# Altium footprint library MOLEX THD.PcbLib: 71 footprints (part 4 of 5) (continued)
## MOLEX_74737-0009 [mm] "SFP+ 1x1 Press Fit Cage"
height 9.7
pads (20):
  round 2 hole 1.05: 1(-30.9,7.125) 2(-20.9,7.125) 3(-10.9,7.125) 4(-10.9,1.445) 5(-30.9,-1.455) 6(-10.9,-3.955) 7(-25.9,-7.125) 8(-15.9,-7.125) 9(-5.9,-7.125) 10(4.1,-7.125)
  round 1.65 hole 0.95: 11(-8.1,7.125) 12(-3.4,7.125) 13(1.6,7.125) 14(6.2,4.8) 15(6.2,0) 16(6.2,-4.8) 17(-8.1,-7.125) 18(-3.4,-7.125) 19(1.6,-7.125)
  round 2 hole 0.85: 20(-0.9,7.125)
Top Overlay:
  drawing of 183 lines, arcs and shapes, not listed
Mechanical 8:
  drawing of 301 lines, arcs and shapes, not listed
Mechanical 14:
  drawing of 208 lines, arcs and shapes, not listed
Drill Drawing:
  lines w0.1: -32.1,-0.2 -11.7,-0.2 -8.1,-3.8 -8.1,-6.125 ; -32.1,2.2 -11.7,2.2 -11.4,1.9 ; -32,4.1 -11.7,4.1 -10.8,5 -3.025,5 -1.9,6.125 ; -32.6,-8.125 -32.6,8.125 6.9,8.125 6.9,-8.125 -32.6,-8.125
  text "PRESS-FIT TECHNOLOGY" at -29.4,-1.8 h1
  text "10x diam. 1.05mm +/-0.05" at -32.2,2.625 h1
  text "9x diam. 0.95mm +/-0.05" at -31.6,0.4 h1
  text "1x diam. 0.85mm +/-0.05" at -31.4,4.5 h1
3D body "MOLEX_74737-0009.stp": height 10.32, standoff -3.02, extent -42.402,-7.84 6.578,7.835

## MOLEX_74737-0111 [mm] "SFP+ 1x1 Cage"
height 9.7
pads (20):
  round 2 hole 1.05: 1(-30.9,7.125) 2(-20.9,7.125) 3(-10.9,7.125) 4(-10.9,1.445) 5(-30.9,-1.455) 6(-10.9,-3.955) 7(-25.9,-7.125) 8(-15.9,-7.125) 9(-5.9,-7.125) 10(4.1,-7.125)
  round 1.65 hole 0.95: 11(-8.1,7.125) 12(-3.4,7.125) 13(1.6,7.125) 14(6.2,4.8) 15(6.2,0) 16(6.2,-4.8) 17(-8.1,-7.125) 18(-3.4,-7.125) 19(1.6,-7.125)
  round 2 hole 0.85: 20(-0.9,7.125)
Top Overlay:
  drawing of 183 lines, arcs and shapes, not listed
Mechanical 8:
  drawing of 301 lines, arcs and shapes, not listed
Mechanical 14:
  drawing of 208 lines, arcs and shapes, not listed
3D body "MOLEX_74737-0111.stp": height 10.6, standoff -3, extent -42.4,-8.149 6.4,8.15

## MOLEX_75640-5001 [mm] "Stacked 2x1 SFP Cage, Medium Height Assembly, Press Fit Tails with 4 Light Pipes"
height 25.8
pads (55):
  round 1.55 hole 1.05: 1(-43.53,7.135) 3(-43.53,-7.115) 4(-35.53,7.135) 5(-35.53,-7.115) 6(-27.53,7.135) 7(-27.53,-7.115) 8(-19.53,7.135) 11(-19.53,-7.115) 12(-11.53,7.135) 13(-11.53,-7.115) 16(8.095,4.01) 17(8.095,0.01) 18(8.095,-3.99)
  round 0.5 hole 1.85 unplated mask+0.675: 14(-1.43,5.51) 15(6.07,-5.49)
  rrect100% 0.95x0.95 hole 0.45: L1(-2.158,-3.395) L2(-0.778,-2.595) L3(-2.158,-1.795) L4(-0.778,-0.995) L5(-2.158,-0.195) L6(-0.778,0.605) L7(-2.158,1.405) L8(-0.778,2.205) L9(-2.158,3.005) L10(-0.778,3.805) L11(-3.708,3.405) L12(-5.098,2.605) L13(-3.708,1.805) L14(-5.098,1.005) L15(-3.708,0.205) L16(-5.098,-0.595) L17(-3.708,-1.395) L18(-5.098,-2.195) L19(-3.708,-2.995) L20(-5.098,-3.795) T1(2.162,3.405) T2(0.772,2.605) T3(2.162,1.805) T4(0.772,1.005) T5(2.162,0.205) T6(0.772,-0.595) T7(2.162,-1.395) T8(0.772,-2.195) T9(2.162,-2.995) T10(0.772,-3.795) T11(3.712,-3.395) T12(5.092,-2.595) T13(3.712,-1.795) T14(5.092,-0.995) T15(3.712,-0.195) T16(5.092,0.605) T17(3.712,1.405) T18(5.092,2.205) T19(3.712,3.005) T20(5.092,3.805)
Top Overlay:
  drawing of 178 lines, arcs and shapes, not listed
  text "LOWER" at -6.197,-2.192 h1
  text "UPPER" at 7.003,-2.095 h1
Mechanical 1:
  circle w0.25: c-2.158,-4.47 r0.125
  circle w0.25: c2.162,4.48 r0.125
  text "UPPER" at 7.003,-2.095 h1
  text "LOWER" at -6.197,-2.192 h1
Mechanical 8:
  drawing of 307 lines, arcs and shapes, not listed
  text "PCB EDGE" at -46.722,-3.417 h1
Mechanical 14:
  drawing of 168 lines, arcs and shapes, not listed
Drill Drawing:
  lines w0.1: -42.122,-3.217 -22.597,-3.217 -19.734,-6.08 ; -42.122,-1.092 -7.822,-1.092 -5.734,-3.18 ; -42.097,0.983 -21.972,0.983 -17.222,5.733 -3.097,5.733 ; -48.028,-7.245 -48.028,7.255 9.272,7.255 9.272,-7.245 -48.028,-7.245
  text "PRESS-FIT TECHNOLOGY" at -41.272,3.308 h1
  text "2x diam. 1.85mm +/-0.05" at -42.197,1.408 h1
  text "PRESS-FIT TECHNOLOGY" at -41.272,3.308 h1
  text "40x diam. 0.45mm +0.06/-0.04" at -42.122,-0.542 h1
  text "13x diam. 1.05mm +/-0.05" at -42.122,-2.617 h1
3D body "MOLEX_75640-5001.stp": height 26.56, standoff -3.26, extent -55.03,-8.981 9.274,8.981

## MOLEX_76001-0010 [mm] "250V 50A Press-Fit Tails (10) Screw Terminal (M3) EXTreme ZPower™ Connector for 3.18mm Thick PC Board"
height 9.8
pads (10):
  round 1.7 hole 1: 1(-6.35,-3.175) 1(-6.35,3.175) 1(-3.175,-3.175) 1(-3.175,3.175) 1(0,-3.175) 1(0,3.175) 1(3.175,-3.175) 1(3.175,3.175) 1(6.35,-3.175) 1(6.35,3.175)
Top Overlay:
  circle w0.2: c0,0 r1.612
  circle w0.2: c0,0 r1.8
  circle w0.2: c4.28,0 r2
  circle w0.2: c-4.28,0 r2
  lines w0.2: -8.145,-4.6 -8.145,4.6 8.145,4.6 8.145,-4.6 -8.145,-4.6
Mechanical 8:
  circle w0.1: c-6.35,3.175 r0.85
  circle w0.1: c-6.35,3.175 r0.5
  lines w0.1: -6.85,-3.175 -6.35,-3.175 ; -6.85,3.175 -6.35,3.175 ; -6.35,-3.675 -6.35,-3.175 ; -6.35,-2.675 -6.35,-3.175 ; -6.35,2.675 -6.35,3.175 ; -6.35,3.675 -6.35,3.175 ; -5.85,-3.175 -6.35,-3.175 ; -5.85,3.175 -6.35,3.175 ; -3.675,-3.175 -3.175,-3.175 ; -3.675,3.175 -3.175,3.175 ; -3.175,-3.675 -3.175,-3.175 ; -3.175,-2.675 -3.175,-3.175 ; -3.175,2.675 -3.175,3.175 ; -3.175,3.675 -3.175,3.175 ; -2.675,-3.175 -3.175,-3.175 ; -2.675,3.175 -3.175,3.175 ; -0.5,-3.175 0,-3.175 ; -0.5,0 0,0 ; -0.5,3.175 0,3.175 ; 0,-3.675 0,-3.175 ; 0,-2.675 0,-3.175 ; 0,-0.5 0,0 ; 0,0.5 0,0 ; 0,2.675 0,3.175 ; 0,3.675 0,3.175 ; 0.5,-3.175 0,-3.175 ; 0.5,0 0,0 ; 0.5,3.175 0,3.175 ; 2.675,-3.175 3.175,-3.175 ; 2.675,3.175 3.175,3.175 ; 3.175,-3.675 3.175,-3.175 ; 3.175,-2.675 3.175,-3.175 ; 3.175,2.675 3.175,3.175 ; 3.175,3.675 3.175,3.175 ; 3.675,-3.175 3.175,-3.175 ; 3.675,3.175 3.175,3.175 ; 5.85,-3.175 6.35,-3.175 ; 5.85,3.175 6.35,3.175 ; 6.35,-3.675 6.35,-3.175 ; 6.35,-2.675 6.35,-3.175 ; 6.35,2.675 6.35,3.175 ; 6.35,3.675 6.35,3.175 ; 6.85,-3.175 6.35,-3.175 ; 6.85,3.175 6.35,3.175
Mechanical 14:
  circle w0.1: c0,0 r1.612
  circle w0.1: c0,0 r1.8
  circle w0.1: c4.28,0 r2
  circle w0.1: c-4.28,0 r2
  lines w0.1: -7.58,-3.8 -7.38,-3.6 ; -7.58,-3.8 -7.58,3.8 ; -7.58,-3.8 7.58,-3.8 ; -7.58,3.8 -7.38,3.6 ; -7.58,3.8 7.58,3.8 ; -7.38,-3.6 -7.38,3.6 ; -7.38,-3.6 7.38,-3.6 ; -7.38,3.6 7.38,3.6 ; 7.38,-3.6 7.58,-3.8 ; 7.38,-3.6 7.38,3.6 ; 7.38,3.6 7.58,3.8 ; 7.58,-3.8 7.58,3.8 ; -8.145,-4.6 -8.145,4.6 8.145,4.6 8.145,-4.6 -8.145,-4.6 ; -7.036,-2.772 7.036,-2.772 7.036,2.772 -7.036,2.772 -7.036,-2.772
Drill Drawing:
  text "+0.07 / -0.03" at -5.2,-1.9 h1
  text "PRESS-FIT TECHNOLOGY" at -8.5,0.9 h1
  text "diam. 1mm" at -4.7,-0.5 h1
3D body "MOLEX_76001-0010.stp": height 9.94, standoff -3.9, extent -8.145,-4.6 8.145,4.6

## MOLEX_79107-7006 [mm] "2.00mm (.079\") Pitch Milli-Grid™ Receptacle, Vertical, Through Hole, Dual Row, 14 Circuits"
height 4.44
pads (14):
  round 1.4 hole 0.7: 1(-6,-1) 2(-6,1) 3(-4,-1) 4(-4,1) 5(-2,-1) 6(-2,1) 7(0,-1) 8(0,1) 9(2,-1) 10(2,1) 11(4,-1) 12(4,1) 13(6,-1) 14(6,1)
Top Overlay:
  circle w0.3: c-6,-2.8 r0.15
  lines w0.2: -7.095,-1.351 -7.095,-2.095 7.095,-2.095 7.095,-1.351 ; -7.095,-0.649 -7.095,0.649 ; -7.095,1.351 -7.095,2.095 7.095,2.095 7.095,1.351 ; 6.965,-0.375 6.965,0.374
Mechanical 8:
  lines w0.1: -6.5,-1 -6,-1 ; -6.5,1 -6,1 ; -6,-1.5 -6,-1 ; -6,-0.5 -6,-1 ; -6,0.5 -6,1 ; -6,1.5 -6,1 ; -5.5,-1 -6,-1 ; -5.5,1 -6,1 ; -4.5,-1 -4,-1 ; -4.5,1 -4,1 ; -4,-1.5 -4,-1 ; -4,-0.5 -4,-1 ; -4,0.5 -4,1 ; -4,1.5 -4,1 ; -3.5,-1 -4,-1 ; -3.5,1 -4,1 ; -2.5,-1 -2,-1 ; -2.5,1 -2,1 ; -2,-1.5 -2,-1 ; -2,-0.5 -2,-1 ; -2,0.5 -2,1 ; -2,1.5 -2,1 ; -1.5,-1 -2,-1 ; -1.5,1 -2,1 ; -0.5,-1 0,-1 ; -0.5,0 0,0 ; -0.5,1 0,1 ; 0,-1.5 0,-1 ; 0,1.5 0,1 ; 0.5,-1 0,-1 ; 0.5,0 0,0 ; 0.5,1 0,1 ; 1.5,-1 2,-1 ; 1.5,1 2,1 ; 2,-1.5 2,-1 ; 2,-0.5 2,-1 ; 2,0.5 2,1 ; 2,1.5 2,1 ; 2.5,-1 2,-1 ; 2.5,1 2,1 ; 3.5,-1 4,-1 ; 3.5,1 4,1 ; 4,-1.5 4,-1 ; 4,-0.5 4,-1 ; 4,0.5 4,1 ; 4,1.5 4,1 ; 4.5,-1 4,-1 ; 4.5,1 4,1 ; 5.5,-1 6,-1 ; 5.5,1 6,1 ; 6,-1.5 6,-1 ; 6,-0.5 6,-1 ; 6,0.5 6,1 ; 6,1.5 6,1 ; 6.5,-1 6,-1 ; 6.5,1 6,1 ; 0,-1 0,-0.5 0,0 ; 0,0 0,0.5 0,1
Mechanical 14:
  drawing of 176 lines, arcs and shapes, not listed
3D body "MOLEX_79107-7006.stp": height 4.44, standoff -3, extent -7.095,-2.095 7.095,2.095

## MOLEX_83611-9006 [mm] "1.27mm Pitch Commercial Micro D, PCB Mount, Right Angle Plug, 9 Circuits"
height 7.82
pads (11):
  rrect50% 1.05x1.4 hole 0.7: 1(2.54,-1.27) 2(1.27,-1.27) 3(0,-1.27) 4(-1.27,-1.27) 5(-2.54,-1.27) 6(1.905,1.27) 7(0.635,1.27) 8(-0.635,1.27) 9(-1.905,1.27)
  round 3.5 hole 2.8: 10(-7.175,2.54) 11(7.176,2.54)
Top Overlay:
  circle w0.5: c2.42,-3.25 r0.25
  lines w0.2: -9.969,8.128 -9.969,7.747 9.97,7.747 9.97,8.128 -9.961,8.128 ; -9.842,7.747 -9.842,2.794 -9.31,2.794 ; -9.652,2.286 -9.31,2.286 ; -9.652,2.794 -9.652,-0.127 -4.699,-0.127 -4.699,2.794 ; -9.009,8.128 -9.009,14.478 -5.342,14.478 -5.342,8.128 ; -8.318,-0.127 -8.318,-0.889 -6.032,-0.889 -6.032,-0.127 ; -8.092,8.128 -8.092,14.478 ; -6.259,8.128 -6.259,14.478 ; -5.041,2.286 -4.699,2.286 ; -5.041,2.794 -4.318,2.794 -4.318,-2.286 -2.962,-2.286 ; -4.325,8.128 -4.325,12.852 4.325,12.852 4.325,8.128 ; 2.962,-2.286 4.318,-2.286 4.318,2.794 5.041,2.794 ; 4.699,2.286 5.041,2.286 ; 4.699,2.794 4.699,-0.127 9.652,-0.127 9.652,2.794 ; 5.342,8.128 5.342,14.478 9.009,14.478 9.009,8.128 ; 6.033,-0.127 6.033,-0.889 8.319,-0.889 8.319,-0.127 ; 6.259,8.128 6.259,14.478 ; 8.092,8.128 8.092,14.478 ; 9.31,2.286 9.652,2.286 ; 9.31,2.794 9.843,2.794 9.843,7.747
  text "1" at 5.095,-2.015 h1.2
  text "9" at -2.295,2.76 h1.2
Mechanical 8:
  lines w0.1: -7.675,2.54 -7.175,2.54 ; -7.175,2.04 -7.175,2.54 ; -7.175,3.04 -7.175,2.54 ; -6.675,2.54 -7.175,2.54 ; -3.04,-1.27 -2.54,-1.27 ; -2.54,-1.77 -2.54,-1.27 ; -2.54,-0.77 -2.54,-1.27 ; -2.405,1.27 -1.905,1.27 ; -2.04,-1.27 -2.54,-1.27 ; -1.905,0.77 -1.905,1.27 ; -1.905,1.77 -1.905,1.27 ; -1.77,-1.27 -1.27,-1.27 ; -1.405,1.27 -1.905,1.27 ; -1.27,-1.77 -1.27,-1.27 ; -1.27,-0.77 -1.27,-1.27 ; -1.135,1.27 -0.635,1.27 ; -0.77,-1.27 -1.27,-1.27 ; -0.635,0.77 -0.635,1.27 ; -0.635,1.77 -0.635,1.27 ; -0.5,-1.27 0,-1.27 ; -0.5,0 0,0 ; -0.135,1.27 -0.635,1.27 ; 0,-1.77 0,-1.27 ; 0,-0.77 0,-1.27 ; 0,-0.5 0,0 ; 0,0.5 0,0 ; 0.135,1.27 0.635,1.27 ; 0.5,-1.27 0,-1.27 ; 0.5,0 0,0 ; 0.635,0.77 0.635,1.27 ; 0.635,1.77 0.635,1.27 ; 0.77,-1.27 1.27,-1.27 ; 1.135,1.27 0.635,1.27 ; 1.27,-1.77 1.27,-1.27 ; 1.27,-0.77 1.27,-1.27 ; 1.405,1.27 1.905,1.27 ; 1.77,-1.27 1.27,-1.27 ; 1.905,0.77 1.905,1.27 ; 1.905,1.77 1.905,1.27 ; 2.04,-1.27 2.54,-1.27 ; 2.405,1.27 1.905,1.27 ; 2.54,-1.77 2.54,-1.27 ; 2.54,-0.77 2.54,-1.27 ; 3.04,-1.27 2.54,-1.27 ; 6.676,2.54 7.176,2.54 ; 7.176,2.04 7.176,2.54 ; 7.176,3.04 7.176,2.54 ; 7.676,2.54 7.176,2.54
Mechanical 14:
  lines w0.1: -9.969,8.128 -9.969,7.747 9.97,7.747 9.97,8.128 -9.961,8.128 ; -9.842,7.747 -9.842,2.794 -4.318,2.794 -4.318,-2.286 4.318,-2.286 4.318,2.794 9.843,2.794 9.843,7.747 ; -9.652,2.286 -4.699,2.286 ; -9.652,2.794 -9.652,-0.127 -4.699,-0.127 -4.699,2.794 ; -9.009,8.128 -9.009,14.478 -5.342,14.478 -5.342,8.128 ; -8.318,-0.127 -8.318,-0.889 -6.032,-0.889 -6.032,-0.127 ; -8.092,8.128 -8.092,14.478 ; -6.259,8.128 -6.259,14.478 ; -4.325,8.128 -4.325,12.852 4.325,12.852 4.325,8.128 ; 4.699,2.286 9.652,2.286 ; 4.699,2.794 4.699,-0.127 9.652,-0.127 9.652,2.794 ; 5.342,8.128 5.342,14.478 9.009,14.478 9.009,8.128 ; 6.033,-0.127 6.033,-0.889 8.319,-0.889 8.319,-0.127 ; 6.259,8.128 6.259,14.478 ; 8.092,8.128 8.092,14.478
  text "1" at 5.095,-2.015 h1.2
  text "9" at -2.295,2.76 h1.2
3D body "MOLEX_83611-9006.stp": height 7.76, standoff -2.79, extent -9.969,-2.286 9.97,14.478

## MOLEX_83612-9020 [mm] "1.27mm Pitch Commercial Micro D, PCB Mount, Right Angle Plug, 15 Circuits"
height 7.82
pads (17):
  rrect50% 1.05x1.4 hole 0.7: 1(4.445,-1.27) 2(3.175,-1.27) 3(1.905,-1.27) 4(0.635,-1.27) 5(-0.635,-1.27) 6(-1.905,-1.27) 7(-3.175,-1.27) 8(-4.445,-1.27) 9(3.81,1.27) 10(2.54,1.27) 11(1.27,1.27) 12(0,1.27) 13(-1.27,1.27) 14(-2.54,1.27) 15(-3.81,1.27)
  round 3.5 hole 2.8: 16(-9.08,2.54) 17(9.08,2.54)
Top Overlay:
  circle w0.5: c4.325,-3.25 r0.25
  lines w0.2: -11.621,7.747 -11.621,3.048 -11.169,3.048 ; -11.557,2.667 -11.226,2.667 ; -11.557,3.048 -11.557,1.397 -10.901,1.397 ; -10.668,12.065 -10.668,16.053 -10.592,16.129 -7.569,16.129 -7.493,16.053 -7.493,12.065 ; -10.351,8.128 -10.351,9.525 ; -7.811,8.128 -7.811,9.525 ; -7.259,1.397 -6.604,1.397 -6.604,3.048 ; -6.991,3.048 -6.287,3.048 -6.287,-2.286 -5.32,-2.286 ; -6.934,2.667 -6.604,2.667 ; -5.842,8.128 -5.842,12.852 5.842,12.852 5.842,8.128 ; 5.32,-2.286 6.287,-2.286 6.287,3.048 6.991,3.048 ; 6.604,2.667 6.934,2.667 ; 6.604,3.048 6.604,1.397 7.259,1.397 ; 7.493,12.065 7.493,16.053 7.569,16.129 10.592,16.129 10.668,16.053 10.668,12.065 ; 7.811,8.128 7.811,9.525 ; 10.351,8.128 10.351,9.525 ; 10.901,1.397 11.557,1.397 11.557,3.048 ; 11.169,3.048 11.621,3.048 11.621,7.747 ; 11.226,2.667 11.557,2.667 ; -11.875,7.747 -11.875,8.128 11.875,8.128 11.875,7.747 -11.875,7.747 ; -10.914,9.525 -10.914,12.065 -7.247,12.065 -7.247,9.525 -10.914,9.525 ; 7.247,9.525 7.247,12.065 10.914,12.065 10.914,9.525 7.247,9.525
  text "1" at 7,-2.015 h1.2
  text "15" at -4.85,2.735 h1.2
Mechanical 8:
  lines w0.1: -9.58,2.54 -9.08,2.54 ; -9.08,2.04 -9.08,2.54 ; -9.08,3.04 -9.08,2.54 ; -8.58,2.54 -9.08,2.54 ; -4.945,-1.27 -4.445,-1.27 ; -4.445,-1.77 -4.445,-1.27 ; -4.445,-0.77 -4.445,-1.27 ; -4.31,1.27 -3.81,1.27 ; -3.945,-1.27 -4.445,-1.27 ; -3.81,0.77 -3.81,1.27 ; -3.81,1.77 -3.81,1.27 ; -3.675,-1.27 -3.175,-1.27 ; -3.31,1.27 -3.81,1.27 ; -3.175,-1.77 -3.175,-1.27 ; -3.175,-0.77 -3.175,-1.27 ; -3.04,1.27 -2.54,1.27 ; -2.675,-1.27 -3.175,-1.27 ; -2.54,0.77 -2.54,1.27 ; -2.54,1.77 -2.54,1.27 ; -2.405,-1.27 -1.905,-1.27 ; -2.04,1.27 -2.54,1.27 ; -1.905,-1.77 -1.905,-1.27 ; -1.905,-0.77 -1.905,-1.27 ; -1.77,1.27 -1.27,1.27 ; -1.405,-1.27 -1.905,-1.27 ; -1.27,0.77 -1.27,1.27 ; -1.27,1.77 -1.27,1.27 ; -1.135,-1.27 -0.635,-1.27 ; -0.77,1.27 -1.27,1.27 ; -0.635,-1.77 -0.635,-1.27 ; -0.635,-0.77 -0.635,-1.27 ; -0.5,0 0,0 ; -0.5,1.27 0,1.27 ; -0.135,-1.27 -0.635,-1.27 ; 0,-0.5 0,0 ; 0,0.5 0,0 ; 0,0.77 0,1.27 ; 0,1.77 0,1.27 ; 0.135,-1.27 0.635,-1.27 ; 0.5,0 0,0 ; 0.5,1.27 0,1.27 ; 0.635,-1.77 0.635,-1.27 ; 0.635,-0.77 0.635,-1.27 ; 0.77,1.27 1.27,1.27 ; 1.135,-1.27 0.635,-1.27 ; 1.27,0.77 1.27,1.27 ; 1.27,1.77 1.27,1.27 ; 1.405,-1.27 1.905,-1.27 ; 1.77,1.27 1.27,1.27 ; 1.905,-1.77 1.905,-1.27 ; 1.905,-0.77 1.905,-1.27 ; 2.04,1.27 2.54,1.27 ; 2.405,-1.27 1.905,-1.27 ; 2.54,0.77 2.54,1.27 ; 2.54,1.77 2.54,1.27 ; 2.675,-1.27 3.175,-1.27 ; 3.04,1.27 2.54,1.27 ; 3.175,-1.77 3.175,-1.27 ; 3.175,-0.77 3.175,-1.27 ; 3.31,1.27 3.81,1.27 ; 3.675,-1.27 3.175,-1.27 ; 3.81,0.77 3.81,1.27 ; 3.81,1.77 3.81,1.27 ; 3.945,-1.27 4.445,-1.27 ; 4.31,1.27 3.81,1.27 ; 4.445,-1.77 4.445,-1.27 ; 4.445,-0.77 4.445,-1.27 ; 4.945,-1.27 4.445,-1.27 ; 8.58,2.54 9.08,2.54 ; 9.08,2.04 9.08,2.54 ; 9.08,3.04 9.08,2.54 ; 9.58,2.54 9.08,2.54
Mechanical 14:
  lines w0.1: -11.621,7.747 -11.621,3.048 -6.287,3.048 -6.287,-2.286 -4.89,-2.286 -4.89,-1.422 4.89,-1.422 4.89,-2.286 6.287,-2.286 6.287,3.048 11.621,3.048 11.621,7.747 ; -11.557,2.667 -6.604,2.667 ; -11.557,3.048 -11.557,1.397 -6.604,1.397 -6.604,3.048 ; -10.668,12.065 -10.668,16.053 -10.592,16.129 -7.569,16.129 -7.493,16.053 -7.493,12.065 ; -10.351,8.128 -10.351,9.525 ; -7.811,8.128 -7.811,9.525 ; -5.842,8.128 -5.842,12.852 5.842,12.852 5.842,8.128 ; 6.604,2.667 11.557,2.667 ; 6.604,3.048 6.604,1.397 11.557,1.397 11.557,3.048 ; 7.493,12.065 7.493,16.053 7.569,16.129 10.592,16.129 10.668,16.053 10.668,12.065 ; 7.811,8.128 7.811,9.525 ; 10.351,8.128 10.351,9.525 ; -11.875,7.747 -11.875,8.128 11.875,8.128 11.875,7.747 -11.875,7.747 ; -10.914,9.525 -10.914,12.065 -7.247,12.065 -7.247,9.525 -10.914,9.525 ; 7.247,9.525 7.247,12.065 10.914,12.065 10.914,9.525 7.247,9.525
  text "1" at 7,-2.015 h1.2
  text "15" at -4.85,2.735 h1.2
3D body "MOLEX_83612-9020.stp": height 7.82, standoff -3.02, extent -11.874,-2.286 11.875,16.129

## MOLEX_83614-9012 [mm] "1.27mm Pitch Commercial Micro D, PCB Mount, Right Angle Plug, 25 Circuits"
height 7.82
pads (27):
  rrect50% 1.05x1.4 hole 0.7: 1(7.62,-1.27) 2(6.35,-1.27) 3(5.08,-1.27) 4(3.81,-1.27) 5(2.54,-1.27) 6(1.27,-1.27) 7(0,-1.27) 8(-1.27,-1.27) 9(-2.54,-1.27) 10(-3.81,-1.27) 11(-5.08,-1.27) 12(-6.35,-1.27) 13(-7.62,-1.27) 14(6.985,1.27) 15(5.715,1.27) 16(4.445,1.27) 17(3.175,1.27) 18(1.905,1.27) 19(0.635,1.27) 20(-0.635,1.27) 21(-1.905,1.27) 22(-3.175,1.27) 23(-4.445,1.27) 24(-5.715,1.27) 25(-6.985,1.27)
  round 3.5 hole 2.8: 26(-12.255,2.54) 27(12.255,2.54)
Top Overlay:
  circle w0.5: c7.5,-3.25 r0.25
  lines w0.2: -14.915,7.747 -14.922,3.048 -14.344,3.048 ; -14.732,2.667 -14.401,2.667 ; -14.732,3.048 -14.732,0.127 -9.779,0.127 -9.779,3.048 ; -13.525,8.128 -13.525,9.525 ; -10.985,8.128 -10.985,9.525 ; -10.166,3.048 -9.525,3.048 -9.525,-2.286 -8.348,-2.286 ; -10.109,2.667 -9.779,2.667 ; -9.294,8.128 -9.294,12.471 cw(c-8.913,12.471) -8.913,12.852 8.913,12.852 cw(c8.913,12.471) 9.294,12.471 9.294,8.128 ; 8.348,-2.286 9.525,-2.286 9.525,3.048 10.166,3.05 ; 9.779,2.667 10.109,2.667 ; 9.779,3.048 9.779,0.127 14.732,0.127 14.732,3.048 ; 10.986,8.128 10.986,9.525 ; 13.526,8.128 13.526,9.525 ; 14.341,3.059 14.923,3.061 14.923,7.747 ; 14.401,2.667 14.732,2.667 ; -15.049,7.747 15.05,7.747 15.05,8.128 -15.049,8.128 -15.049,7.747 ; -13.843,9.525 -10.668,9.525 -10.668,15.9 -10.744,15.977 -13.767,15.977 -13.843,15.9 -13.843,9.525 ; 10.668,9.525 13.843,9.525 13.843,15.9 13.767,15.977 10.744,15.977 10.668,15.9 10.668,9.525
  text "25" at -8.025,2.735 h1.2
  text "1" at 10.175,-2.015 h1.2
Mechanical 8:
  lines w0.1: -12.755,2.54 -12.255,2.54 ; -12.255,2.04 -12.255,2.54 ; -12.255,3.04 -12.255,2.54 ; -11.755,2.54 -12.255,2.54 ; -8.12,-1.27 -7.62,-1.27 ; -7.62,-1.77 -7.62,-1.27 ; -7.62,-0.77 -7.62,-1.27 ; -7.485,1.27 -6.985,1.27 ; -7.12,-1.27 -7.62,-1.27 ; -6.985,0.77 -6.985,1.27 ; -6.985,1.77 -6.985,1.27 ; -6.85,-1.27 -6.35,-1.27 ; -6.485,1.27 -6.985,1.27 ; -6.35,-1.77 -6.35,-1.27 ; -6.35,-0.77 -6.35,-1.27 ; -6.215,1.27 -5.715,1.27 ; -5.85,-1.27 -6.35,-1.27 ; -5.715,0.77 -5.715,1.27 ; -5.715,1.77 -5.715,1.27 ; -5.58,-1.27 -5.08,-1.27 ; -5.215,1.27 -5.715,1.27 ; -5.08,-1.77 -5.08,-1.27 ; -5.08,-0.77 -5.08,-1.27 ; -4.945,1.27 -4.445,1.27 ; -4.58,-1.27 -5.08,-1.27 ; -4.445,0.77 -4.445,1.27 ; -4.445,1.77 -4.445,1.27 ; -4.31,-1.27 -3.81,-1.27 ; -3.945,1.27 -4.445,1.27 ; -3.81,-1.77 -3.81,-1.27 ; -3.81,-0.77 -3.81,-1.27 ; -3.675,1.27 -3.175,1.27 ; -3.31,-1.27 -3.81,-1.27 ; -3.175,0.77 -3.175,1.27 ; -3.175,1.77 -3.175,1.27 ; -3.04,-1.27 -2.54,-1.27 ; -2.675,1.27 -3.175,1.27 ; -2.54,-1.77 -2.54,-1.27 ; -2.54,-0.77 -2.54,-1.27 ; -2.405,1.27 -1.905,1.27 ; -2.04,-1.27 -2.54,-1.27 ; -1.905,0.77 -1.905,1.27 ; -1.905,1.77 -1.905,1.27 ; -1.77,-1.27 -1.27,-1.27 ; -1.405,1.27 -1.905,1.27 ; -1.27,-1.77 -1.27,-1.27 ; -1.27,-0.77 -1.27,-1.27 ; -1.135,1.27 -0.635,1.27 ; -0.77,-1.27 -1.27,-1.27 ; -0.635,0.77 -0.635,1.27 ; -0.635,1.77 -0.635,1.27 ; -0.5,-1.27 0,-1.27 ; -0.5,0 0,0 ; -0.135,1.27 -0.635,1.27 ; 0,-1.77 0,-1.27 ; 0,-0.77 0,-1.27 ; 0,-0.5 0,0 ; 0,0.5 0,0 ; 0.135,1.27 0.635,1.27 ; 0.5,-1.27 0,-1.27 ; 0.5,0 0,0 ; 0.635,0.77 0.635,1.27 ; 0.635,1.77 0.635,1.27 ; 0.77,-1.27 1.27,-1.27 ; 1.135,1.27 0.635,1.27 ; 1.27,-1.77 1.27,-1.27 ; 1.27,-0.77 1.27,-1.27 ; 1.405,1.27 1.905,1.27 ; 1.77,-1.27 1.27,-1.27 ; 1.905,0.77 1.905,1.27 ; 1.905,1.77 1.905,1.27 ; 2.04,-1.27 2.54,-1.27 ; 2.405,1.27 1.905,1.27 ; 2.54,-1.77 2.54,-1.27 ; 2.54,-0.77 2.54,-1.27 ; 2.675,1.27 3.175,1.27 ; 3.04,-1.27 2.54,-1.27 ; 3.175,0.77 3.175,1.27 ; 3.175,1.77 3.175,1.27 ; 3.31,-1.27 3.81,-1.27 ; 3.675,1.27 3.175,1.27 ; 3.81,-1.77 3.81,-1.27 ; 3.81,-0.77 3.81,-1.27 ; 3.945,1.27 4.445,1.27 ; 4.31,-1.27 3.81,-1.27 ; 4.445,0.77 4.445,1.27 ; 4.445,1.77 4.445,1.27 ; 4.58,-1.27 5.08,-1.27 ; 4.945,1.27 4.445,1.27 ; 5.08,-1.77 5.08,-1.27 ; 5.08,-0.77 5.08,-1.27 ; 5.215,1.27 5.715,1.27 ; 5.58,-1.27 5.08,-1.27 ; 5.715,0.77 5.715,1.27 ; 5.715,1.77 5.715,1.27 ; 5.85,-1.27 6.35,-1.27 ; 6.215,1.27 5.715,1.27 ; 6.35,-1.77 6.35,-1.27 ; 6.35,-0.77 6.35,-1.27 ; 6.485,1.27 6.985,1.27 ; 6.85,-1.27 6.35,-1.27 ; 6.985,0.77 6.985,1.27 ; 6.985,1.77 6.985,1.27 ; 7.12,-1.27 7.62,-1.27 ; 7.485,1.27 6.985,1.27 ; 7.62,-1.77 7.62,-1.27 ; 7.62,-0.77 7.62,-1.27 ; 8.12,-1.27 7.62,-1.27 ; 11.755,2.54 12.255,2.54 ; 12.255,2.04 12.255,2.54 ; 12.255,3.04 12.255,2.54 ; 12.755,2.54 12.255,2.54
Mechanical 14:
  lines w0.1: -14.915,7.747 -14.922,3.048 -9.525,3.048 -9.525,-2.286 -8.001,-2.286 -8.001,-1.422 8.001,-1.422 8.001,-2.286 9.525,-2.286 9.525,3.048 14.923,3.061 14.923,7.747 ; -14.732,2.667 -9.779,2.667 ; -14.732,3.048 -14.732,0.127 -9.779,0.127 -9.779,3.048 ; -13.525,8.128 -13.525,9.525 ; -10.985,8.128 -10.985,9.525 ; -9.294,8.128 -9.294,12.471 cw(c-8.913,12.471) -8.913,12.852 8.913,12.852 cw(c8.913,12.471) 9.294,12.471 9.294,8.128 ; 9.779,2.667 14.732,2.667 ; 9.779,3.048 9.779,0.127 14.732,0.127 14.732,3.048 ; 10.986,8.128 10.986,9.525 ; 13.526,8.128 13.526,9.525 ; -15.049,7.747 15.05,7.747 15.05,8.128 -15.049,8.128 -15.049,7.747 ; -13.843,9.525 -10.668,9.525 -10.668,15.9 -10.744,15.977 -13.767,15.977 -13.843,15.9 -13.843,9.525 ; 10.668,9.525 13.843,9.525 13.843,15.9 13.767,15.977 10.744,15.977 10.668,15.9 10.668,9.525
  text "25" at -8.025,2.735 h1.2
  text "1" at 10.175,-2.015 h1.2
3D body "MOLEX_83614-9012.stp": height 7.68, standoff -3.18, extent -15.049,-2.286 15.05,15.977

## MOLEX_87831-1420 [mm] "2.00mm (.079\") Pitch Milli-Grid™ Header, Vertical, Shrouded, Center Polarization Slot, Locking Window, 14 Circuits"
height 6.4
pads (14):
  round 1.6 hole 0.9: 1(-6,-1) 2(-6,1) 3(-4,-1) 4(-4,1) 5(-2,-1) 6(-2,1) 7(0,-1) 8(0,1) 9(2,-1) 10(2,1) 11(4,-1) 12(4,1) 13(6,-1) 14(6,1)
Top Overlay:
  circle w0.3: c-6,-3.6 r0.15
  lines w0.2: -8.325,-2.125 -8.025,-2.125 ; -8.325,-1.525 -7.425,-1.525 ; -8.325,0.225 -7.425,0.225 ; -8.325,0.825 -8.025,0.825 ; -7.425,-2.25 -8.025,-2.85 ; -6.325,-3.15 -6.325,-3.05 -5.325,-3.05 -5.325,-3.15 ; -1.8,-3.15 -1.8,-2.85 -8.025,-2.85 ; -1.2,-3.15 -1.2,-2.497 -2.6,-2.497 -2.6,-2.25 -3.4,-2.25 -3.4,-2.5 -7.425,-2.5 -7.425,-1.525 ; 1.2,-3.15 1.2,-2.497 2.6,-2.497 2.6,-2.25 3.4,-2.25 3.4,-2.5 7.425,-2.5 7.425,-0.225 ; 1.8,-3.15 1.8,-2.85 8.025,-2.85 ; 7.425,-2.25 8.025,-2.85 ; 8.325,-0.825 8.025,-0.825 ; 8.325,-0.225 7.425,-0.225 ; 8.325,1.525 7.425,1.525 ; 8.325,2.125 8.025,2.125 ; -8.025,-2.85 -8.025,-2.125 ; -8.025,-2.125 -7.425,-1.525 ; -8.025,0.825 -7.425,0.225 ; -8.025,0.825 -8.025,2.85 ; -8.025,2.85 -7.425,2.25 ; -8.025,2.85 8.025,2.85 ; -7.425,0.225 -7.425,2.25 ; -7.425,2.25 -7.025,2.25 -7.025,2.5 -6.4,2.5 -6.4,2.25 -5.6,2.25 -5.6,2.5 -4.4,2.5 -4.4,2.25 -3.6,2.25 -3.6,2.5 -2.4,2.5 -2.4,2.25 -1.6,2.25 -1.6,2.5 -0.4,2.5 -0.4,2.25 0.4,2.25 0.4,2.5 1.6,2.5 1.6,2.25 2.4,2.25 2.4,2.5 3.6,2.5 3.6,2.25 4.4,2.25 4.4,2.5 5.6,2.5 5.6,2.25 6.4,2.25 6.4,2.5 7.025,2.5 7.025,2.25 7.425,2.25 ; 7.425,-0.225 8.025,-0.825 ; 7.425,1.525 8.025,2.125 ; 7.425,1.525 7.425,2.25 ; 7.425,2.25 8.025,2.85 ; 8.025,-2.85 8.025,-0.825 ; 8.025,2.125 8.025,2.85 ; -8.325,-3.15 -8.325,3.15 8.325,3.15 8.325,-3.15 -8.325,-3.15
  text "1" at -8.032,-1.229 h1.02
Mechanical 8:
  lines w0.1: -6.5,-1 -6,-1 ; -6.5,1 -6,1 ; -6,-1.5 -6,-1 ; -6,-0.5 -6,-1 ; -6,0.5 -6,1 ; -6,1.5 -6,1 ; -5.5,-1 -6,-1 ; -5.5,1 -6,1 ; -4.5,-1 -4,-1 ; -4.5,1 -4,1 ; -4,-1.5 -4,-1 ; -4,-0.5 -4,-1 ; -4,0.5 -4,1 ; -4,1.5 -4,1 ; -3.5,-1 -4,-1 ; -3.5,1 -4,1 ; -2.5,-1 -2,-1 ; -2.5,1 -2,1 ; -2,-1.5 -2,-1 ; -2,-0.5 -2,-1 ; -2,0.5 -2,1 ; -2,1.5 -2,1 ; -1.5,-1 -2,-1 ; -1.5,1 -2,1 ; -0.5,-1 0,-1 ; -0.5,0 0,0 ; -0.5,1 0,1 ; 0,-1.5 0,-1 ; 0,1.5 0,1 ; 0.5,-1 0,-1 ; 0.5,0 0,0 ; 0.5,1 0,1 ; 1.5,-1 2,-1 ; 1.5,1 2,1 ; 2,-1.5 2,-1 ; 2,-0.5 2,-1 ; 2,0.5 2,1 ; 2,1.5 2,1 ; 2.5,-1 2,-1 ; 2.5,1 2,1 ; 3.5,-1 4,-1 ; 3.5,1 4,1 ; 4,-1.5 4,-1 ; 4,-0.5 4,-1 ; 4,0.5 4,1 ; 4,1.5 4,1 ; 4.5,-1 4,-1 ; 4.5,1 4,1 ; 5.5,-1 6,-1 ; 5.5,1 6,1 ; 6,-1.5 6,-1 ; 6,-0.5 6,-1 ; 6,0.5 6,1 ; 6,1.5 6,1 ; 6.5,-1 6,-1 ; 6.5,1 6,1 ; 0,-1 0,-0.5 0,0 ; 0,0 0,0.5 0,1
Mechanical 14:
  lines w0.1: -8.325,-2.125 -8.025,-2.125 ; -8.325,-1.525 -7.425,-1.525 ; -8.325,0.225 -7.425,0.225 ; -8.325,0.825 -8.025,0.825 ; -7.425,-2.25 -8.025,-2.85 ; -6.325,-3.15 -6.325,-3.05 -5.325,-3.05 -5.325,-3.15 ; -1.8,-3.15 -1.8,-2.85 -8.025,-2.85 ; -1.2,-3.15 -1.2,-2.497 -2.6,-2.497 -2.6,-2.25 -3.4,-2.25 -3.4,-2.5 -7.425,-2.5 -7.425,-1.525 ; 1.2,-3.15 1.2,-2.497 2.6,-2.497 2.6,-2.25 3.4,-2.25 3.4,-2.5 7.425,-2.5 7.425,-0.225 ; 1.8,-3.15 1.8,-2.85 8.025,-2.85 ; 7.425,-2.25 8.025,-2.85 ; 8.325,-0.825 8.025,-0.825 ; 8.325,-0.225 7.425,-0.225 ; 8.325,1.525 7.425,1.525 ; 8.325,2.125 8.025,2.125 ; -8.025,-2.85 -8.025,-2.125 ; -8.025,-2.125 -7.425,-1.525 ; -8.025,0.825 -7.425,0.225 ; -8.025,0.825 -8.025,2.85 ; -8.025,2.85 -7.425,2.25 ; -8.025,2.85 8.025,2.85 ; -7.425,0.225 -7.425,2.25 ; -7.425,2.25 -7.025,2.25 -7.025,2.5 -6.4,2.5 -6.4,2.25 -5.6,2.25 -5.6,2.5 -4.4,2.5 -4.4,2.25 -3.6,2.25 -3.6,2.5 -2.4,2.5 -2.4,2.25 -1.6,2.25 -1.6,2.5 -0.4,2.5 -0.4,2.25 0.4,2.25 0.4,2.5 1.6,2.5 1.6,2.25 2.4,2.25 2.4,2.5 3.6,2.5 3.6,2.25 4.4,2.25 4.4,2.5 5.6,2.5 5.6,2.25 6.4,2.25 6.4,2.5 7.025,2.5 7.025,2.25 7.425,2.25 ; 7.425,-0.225 8.025,-0.825 ; 7.425,1.525 8.025,2.125 ; 7.425,1.525 7.425,2.25 ; 7.425,2.25 8.025,2.85 ; 8.025,-2.85 8.025,-0.825 ; 8.025,2.125 8.025,2.85 ; -8.325,-3.15 -8.325,3.15 8.325,3.15 8.325,-3.15 -8.325,-3.15 ; -6.25,-1.25 -6.25,-0.75 -5.75,-0.75 -5.75,-1.25 -6.25,-1.25 ; -6.25,0.75 -6.25,1.25 -5.75,1.25 -5.75,0.75 -6.25,0.75 ; -4.25,-1.25 -4.25,-0.75 -3.75,-0.75 -3.75,-1.25 -4.25,-1.25 ; -4.25,0.75 -4.25,1.25 -3.75,1.25 -3.75,0.75 -4.25,0.75 ; -2.25,-1.25 -2.25,-0.75 -1.75,-0.75 -1.75,-1.25 -2.25,-1.25 ; -2.25,0.75 -2.25,1.25 -1.75,1.25 -1.75,0.75 -2.25,0.75 ; -0.25,-1.25 -0.25,-0.75 0.25,-0.75 0.25,-1.25 -0.25,-1.25 ; -0.25,0.75 -0.25,1.25 0.25,1.25 0.25,0.75 -0.25,0.75 ; 1.75,-1.25 1.75,-0.75 2.25,-0.75 2.25,-1.25 1.75,-1.25 ; 1.75,0.75 1.75,1.25 2.25,1.25 2.25,0.75 1.75,0.75 ; 3.75,-1.25 3.75,-0.75 4.25,-0.75 4.25,-1.25 3.75,-1.25 ; 3.75,0.75 3.75,1.25 4.25,1.25 4.25,0.75 3.75,0.75 ; 5.75,-1.25 5.75,-0.75 6.25,-0.75 6.25,-1.25 5.75,-1.25 ; 5.75,0.75 5.75,1.25 6.25,1.25 6.25,0.75 5.75,0.75
  text "1" at -8.032,-1.229 h1.02
3D body "MOLEX_87831-1420.stp": height 6.4, standoff -2.5, extent -8.325,-3.15 8.325,3.15